# Altium footprint library Face_InMain1V0.PcbLib: 83 footprints (part 1 of 6)
Each footprint in its own frame and in the unit in brackets; x right, y up, seen from the top. Pads: shape width x height; smd on the part's side, far side on the other; paste and mask are expansions set on the pad; w line width, h text height; cw(c..) or ccw(c..) is an arc to the next point about the centre after c.
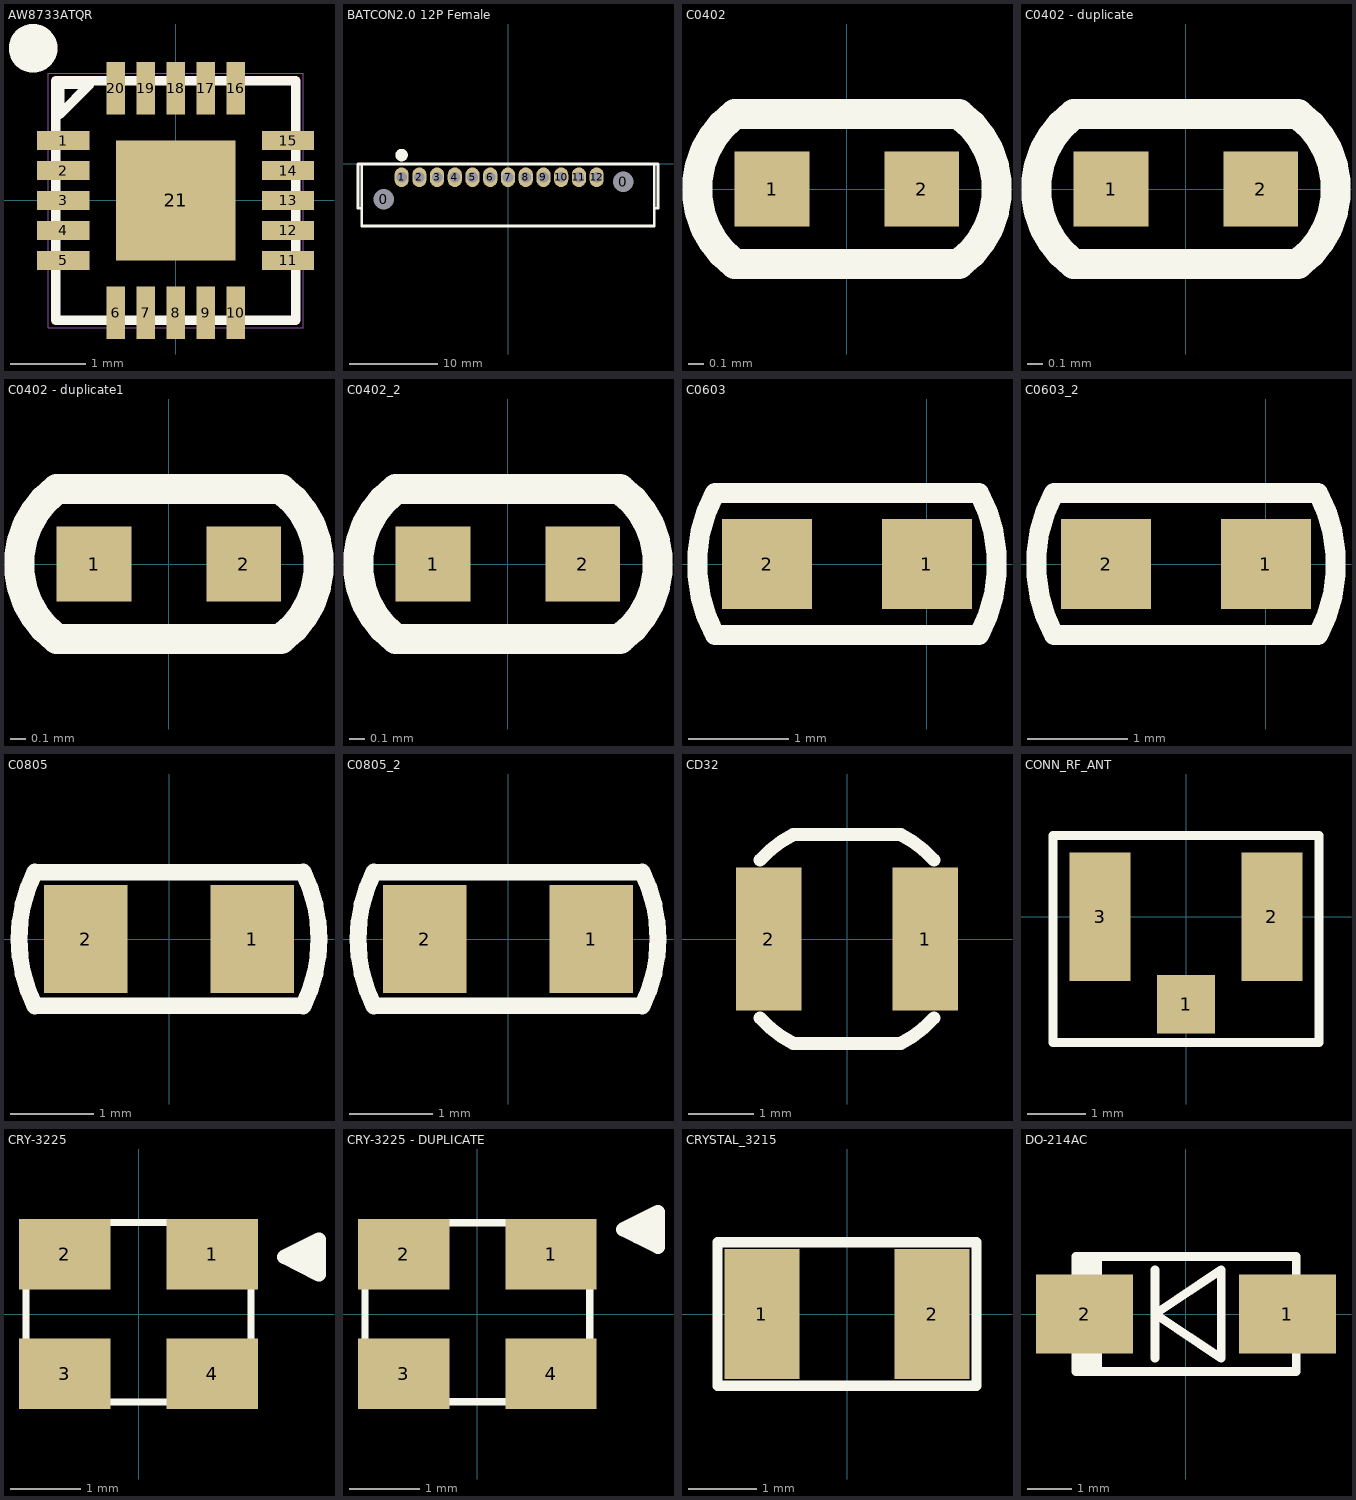
[diagram p0: the footprints below, top view; thin cyan lines are the x and y axes]

## AW8733ATQR [mm]
pads (21):
  rect 0.7x0.25 smd mask+0.06: 1(-1.5,0.8) 2(-1.5,0.4) 3(-1.5,0) 4(-1.5,-0.4) 5(-1.5,-0.8) 11(1.5,-0.8) 12(1.5,-0.4) 13(1.5,0) 14(1.5,0.4) 15(1.5,0.8)
  rect 0.25x0.7 smd mask+0.06: 6(-0.8,-1.5) 7(-0.4,-1.5) 8(0,-1.5) 9(0.4,-1.5) 10(0.8,-1.5) 16(0.8,1.5) 17(0.4,1.5) 18(0,1.5) 19(-0.4,1.5) 20(-0.8,1.5)
  rect 1.6x1.6 smd mask+0.06: 21(0,0)
Top Overlay:
  lines w0.127: -1.6,-1.6 -1.6,1.6 1.6,1.6 1.6,-1.6 -1.6,-1.6 ; -1.55,1.15 -1.55,1.55 -1.15,1.55 -1.55,1.15
  lines w0.4: -1.78,2.031 cw(c-1.905,2.032) -1.78,2.033
Mechanical 13:
  lines w0.013: -1.7,-1.7 1.7,-1.7 1.7,1.7 -1.7,1.7 -1.7,-1.7

## BATCON2.0 12P Female [mm]
pads (14):
  round 2 hole 2.3: 0(-14,-4) 0(13,-2)
  oval 1.6x2.2 hole 1.2: 1(-12,-1.5) 2(-10,-1.5) 3(-8,-1.5) 4(-6,-1.5) 5(-4,-1.5) 6(-2,-1.5) 7(0,-1.5) 8(2,-1.5) 9(4,-1.5) 10(6,-1.5) 11(8,-1.5) 12(10,-1.5)
Top Overlay:
  circle w0.7: c-12,1 r0.35
  lines w0.3: -16.5,-5 -16.925,-5 -16.925,0 16.925,0 16.925,-5 16.5,-5 ; -16.5,0 -16.5,-7 16.5,-7 16.5,0
3D body "BAT2.0 12P Female.SLDPRT": height 6.5, standoff -1.2, extent -16.925,-7 16.925,0

## C0402 [mm]
pads (2):
  rect 0.5x0.5 smd: 1(-0.5,0) 2(0.5,0)
Top Overlay:
  lines w0.2: -0.75,-0.5 cw(c-0.38,0) -0.75,0.5 0.75,0.5 cw(c0.381,0) 0.75,-0.5 -0.75,-0.5
3D body "SW3dPS-0402 SMD Capacitor.STEP": height 0.2, standoff 0, extent -0.5,-0.3 0.5,0.3

## C0402 - duplicate [mm]
pads (2):
  rect 0.5x0.5 smd: 1(-0.5,0) 2(0.5,0)
Top Overlay:
  lines w0.2: -0.75,-0.5 cw(c-0.38,0) -0.75,0.5 0.75,0.5 cw(c0.381,0) 0.75,-0.5 -0.75,-0.5
3D body "SW3dPS-0402 SMD Capacitor.STEP": height 0.2, standoff 0, extent -0.5,-0.3 0.5,0.3

## C0402 - duplicate1 [mm]
pads (2):
  rect 0.5x0.5 smd: 1(-0.5,0) 2(0.5,0)
Top Overlay:
  lines w0.2: -0.75,-0.5 cw(c-0.38,0) -0.75,0.5 0.75,0.5 cw(c0.381,0) 0.75,-0.5 -0.75,-0.5
3D body "SW3dPS-0402 SMD Capacitor.STEP": height 0.2, standoff 0, extent -0.5,-0.3 0.5,0.3

## C0402_2 [mm]
pads (2):
  rect 0.5x0.5 smd: 1(-0.5,0) 2(0.5,0)
Top Overlay:
  lines w0.2: -0.75,-0.5 cw(c-0.38,0) -0.75,0.5 0.75,0.5 cw(c0.381,0) 0.75,-0.5 -0.75,-0.5
3D body "SW3dPS-0402 SMD Capacitor.STEP": height 0.2, standoff 0, extent -0.5,-0.3 0.5,0.3

## C0603 [mm]
pads (2):
  rect 0.9x0.9 smd: 1(0,0) 2(-1.6,0)
Top Overlay:
  lines w0.2: -2.121,0.71 ccw(c-0.8,0) -2.121,-0.711 0.521,-0.711 ; -2.121,0.711 0.521,0.711 cw(c-0.8,0) 0.521,-0.71
3D body "SW3dPS-0603 SMD Capacitor.STEP": height 0.3, standoff 0, extent -1.6,-0.4 0,0.4

## C0603_2 [mm]
pads (2):
  rect 0.9x0.9 smd: 1(0,0) 2(-1.6,0)
Top Overlay:
  lines w0.2: -2.121,0.71 ccw(c-0.8,0) -2.121,-0.711 0.521,-0.711 ; -2.121,0.711 0.521,0.711 cw(c-0.8,0) 0.521,-0.71
3D body "SW3dPS-0603 SMD Capacitor.STEP": height 0.3, standoff 0, extent -1.6,-0.4 0,0.4

## C0805 [mm]
pads (2):
  rect 1x1.3 smd: 1(1,0) 2(-1,0)
Top Overlay:
  lines w0.2: -1.61,-0.805 cw(c0,0) -1.61,0.805 ; -1.6,-0.8 1.6,-0.8 ; -1.6,0.8 1.6,0.8 ; 1.61,-0.805 ccw(c0,0) 1.61,0.805
3D body "SW3dPS-0805 SMD Capacitor.STEP": height 0.78, standoff 0, extent -1,-0.625 1,0.625

## C0805_2 [mm]
pads (2):
  rect 1x1.3 smd: 1(1,0) 2(-1,0)
Top Overlay:
  lines w0.2: -1.61,-0.805 cw(c0,0) -1.61,0.805 ; -1.6,-0.8 1.6,-0.8 ; -1.6,0.8 1.6,0.8 ; 1.61,-0.805 ccw(c0,0) 1.61,0.805
3D body "SW3dPS-0805 SMD Capacitor.STEP": height 0.78, standoff 0, extent -1,-0.625 1,0.625

## CD32 [mm]
pads (2):
  rect 1x2.2 smd mask+0.05: 1(1.2,0) 2(-1.2,0)
Top Overlay:
  lines w0.2: -1.334,-1.208 ccw(c0,0) -0.825,-1.6 0.825,-1.6 ccw(c0,0) 1.334,-1.208 ; -1.334,1.208 cw(c0,0) -0.825,1.6 0.825,1.6 cw(c0,0) 1.334,1.208
3D body "User Library-CD32 inductor.STEP": height 2.1, standoff 0, extent -1.651,-1.5 1.651,1.5

## CONN_RF_ANT [mm]
pads (3):
  rect 1x1 smd: 1(0,-1.5)
  rect 1.05x2.2 smd: 2(1.475,0) 3(-1.475,0)
Top Overlay:
  lines w0.152: -2.286,-2.159 -2.286,1.397 2.286,1.397 2.286,-2.159 -2.286,-2.159

## CRY-3225 [mm]
pads (4):
  rect 1.3x1 smd paste+0 mask+0.05: 1(1.05,0.85) 2(-1.05,0.85) 3(-1.05,-0.85) 4(1.05,-0.85)
Top Overlay:
  lines w0.102: -1.6,-1.25 -1.6,1.3 1.6,1.3 1.6,-1.25 -1.6,-1.25
  lines w0.2: 2.265,0.712 2.565,0.712 ; 2.265,0.912 2.565,0.912 ; 2.565,0.812 2.065,0.812 ; 2.065,0.812 2.565,0.562 2.565,1.062 2.065,0.812
3D body "User Library-3225-1.STEP": height 0.61, standoff 0, extent -1.6,-1.25 1.6,1.25

## CRY-3225 - DUPLICATE [mm]
pads (4):
  rect 1.3x1 smd paste+0 mask+0.05: 1(1.05,0.85) 2(-1.05,0.85) 3(-1.05,-0.85) 4(1.05,-0.85)
Top Overlay:
  lines w0.102: -1.6,-1.25 1.6,-1.25 1.6,1.3 -1.6,1.3 -1.6,-1.25
  lines w0.2: 2.273,1.106 2.573,1.106 ; 2.273,1.306 2.573,1.306 ; 2.573,1.206 2.073,1.206 ; 2.073,1.206 2.573,1.456 2.573,0.956 2.073,1.206
3D body "User Library-3225-1.STEP": height 0.61, standoff 0, extent -1.6,-1.25 1.6,1.25

## CRYSTAL_3215 [mm]
pads (2):
  rect 1.1x1.9 smd: 1(-1.25,0) 2(1.25,0)
Top Overlay:
  lines w0.152: -1.9,-1.05 -1.9,1.05 1.9,1.05 1.9,-1.05 -1.9,-1.05

## DO-214AC [mm]
pads (2):
  rect 2.2x1.8 smd: 1(2.3,0) 2(-2.3,0)
Top Overlay:
  lines w0.2: -2.4,-1.2 -2.4,-0.9 ; -2.4,0.9 -2.4,1.3 ; -2.3,-0.9 -2,-0.9 -2,-1.3 ; -2.3,0.9 -2,0.9 -2,1.3 ; -2.2,-1.3 -2.2,-0.9 -2.5,-0.9 -2.5,-1.3 2.5,-1.3 2.5,-0.9 ; -2.2,1.3 -2.2,0.9 -2.5,0.9 -2.5,1.3 2.5,1.3 2.5,0.9 ; -0.7,-1 -0.7,1 ; -0.7,0 0.8,-1 0.8,1 -0.7,0
3D body "User Library-DO-214AC(SMA).STEP": height 2.24, standoff -0.04, extent -2.673,-1.387 2.813,1.407